# Altium footprint library XU-GENARAL PCB .PcbLib: 1176 footprints (part 33 of 75)
Each footprint in its own frame and in the unit in brackets; x right, y up, seen from the top. Pads: shape width x height; smd on the part's side, far side on the other; paste and mask are expansions set on the pad; w line width, h text height; cw(c..) or ccw(c..) is an arc to the next point about the centre after c.
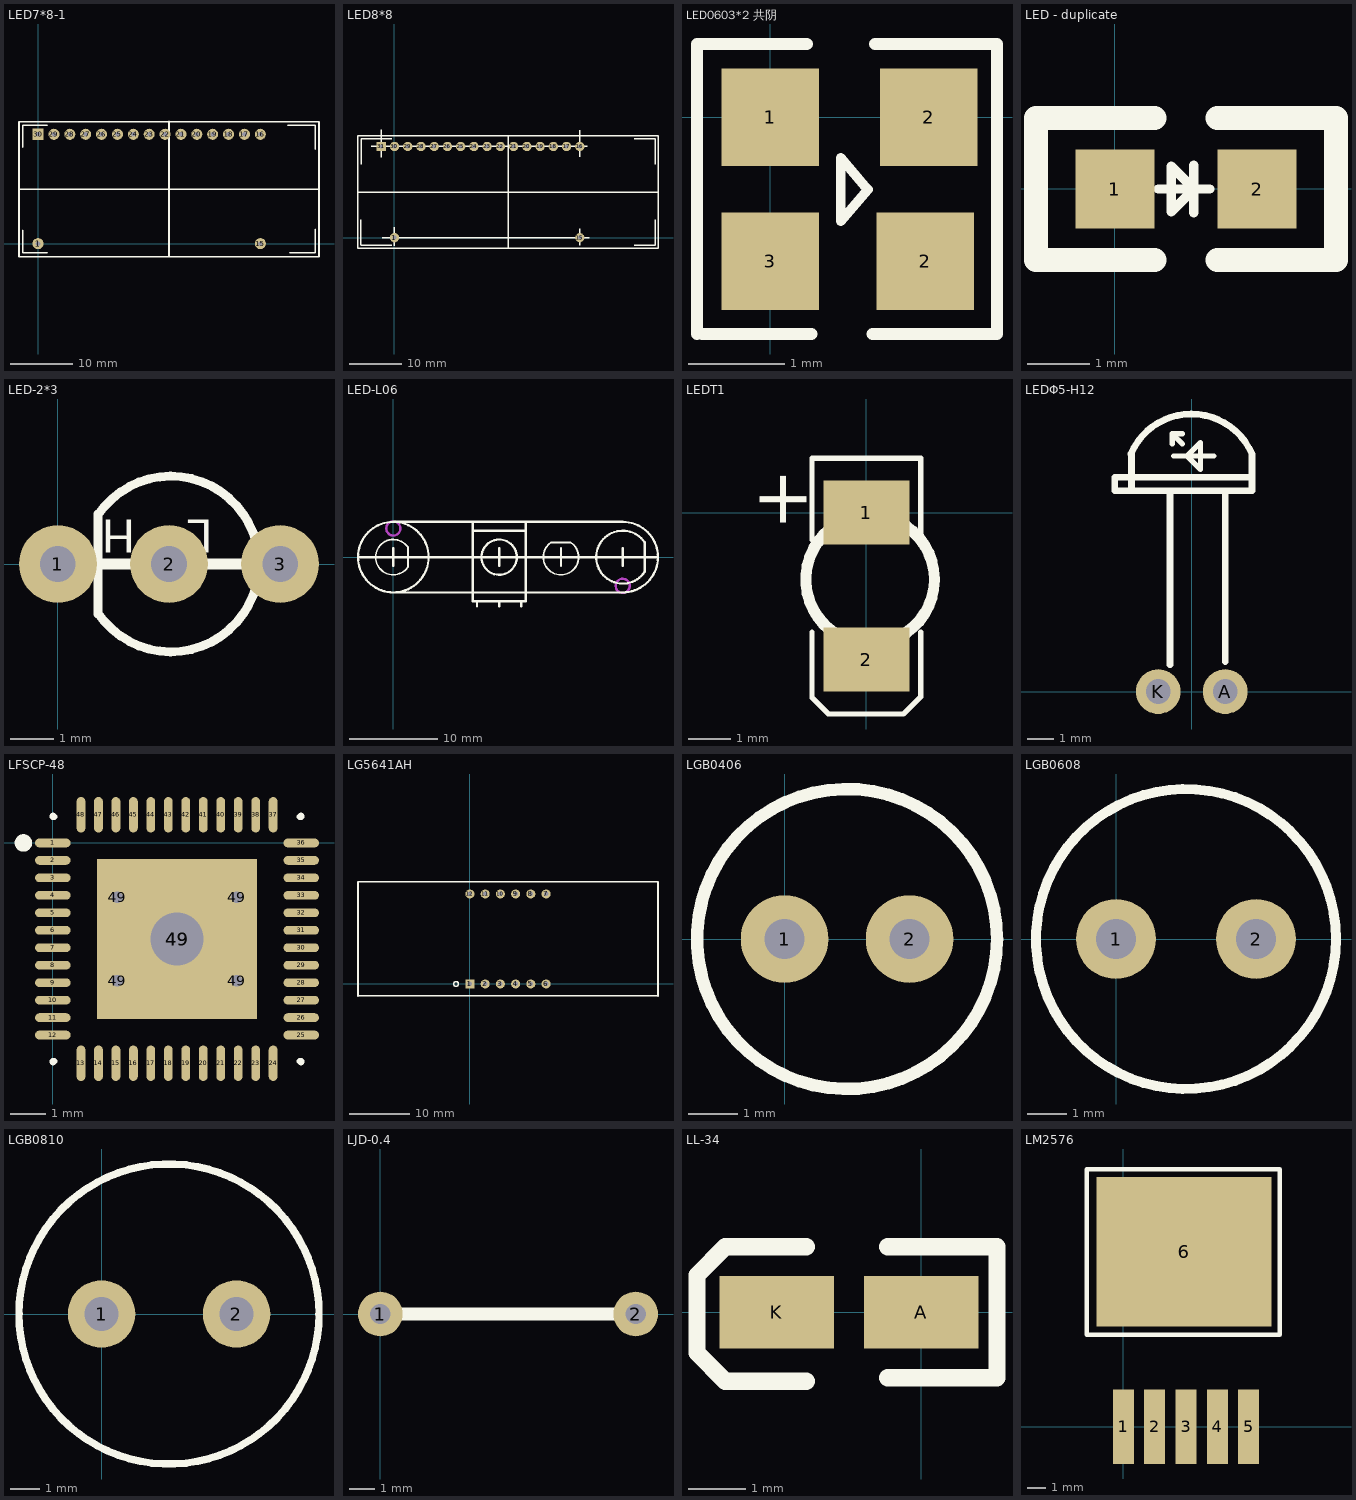
[diagram p32: the footprints below, top view; thin cyan lines are the x and y axes]

## LED7*8-1 [mil]
pads (17):
  round 70 hole 30: 1(0,0) 15(1400,0) 16(1400,688.98) 17(1300,688.98) 18(1200,688.98) 19(1100,688.98) 20(1000,688.98) 21(900,688.98) 22(800,688.98) 23(700,688.98) 24(600,688.98) 25(500,688.98) 26(400,688.98) 27(300,688.98) 28(200,688.98) 29(100,688.98)
  rect 70x70 hole 30: 30(0,688.98)
Top Overlay:
  lines w10: -120.12,343.78 1769.65,343.78 ; -96.38,83 -96.38,-57.8 57.09,-57.8 ; -96.38,607 -96.38,745.36 57.09,745.36 ; 824.88,-81.42 824.88,769.75 ; 1573.91,745.36 1746,745.36 1746.03,595 ; 1585.91,-57.8 1746.03,-57.8 1746.03,91 ; -120,-81.42 1769.65,-81.42 1769.65,768.98 -120,768.98 -120,-81.42

## LED8*8 [mil]
pads (18):
  round 70 hole 30: 1(0,0) 15(1400,0) 16(1400,688.98) 17(1300,688.98) 18(1200,688.98) 19(1100,688.98) 20(1000,688.98) 21(900,688.98) 22(800,688.98) 23(700,688.98) 24(600,688.98) 25(500,688.98) 26(400,688.98) 27(300,688.98) 28(200,688.98) 29(100,688.98) 30(0,688.98)
  rect 70x70 hole 30: 31(-100,688.98)
Top Overlay:
  lines w10: -275.59,344.49 1990.55,344.49 ; -255.91,-57.09 -255.91,135.83 ; -251.97,-57.09 -20.87,-57.09 ; -251.97,553.15 -251.97,746.06 -20.87,746.06 ; -174.02,688.98 -100,688.98 ; -100,607 -100,688.98 ; -100,816 -100,688.98 ; -93,0 0,0 ; 0,-60 0,0 ; 0,80 0,0 ; 857.48,-80.71 857.48,769.68 ; 1400,-56 1400,0 ; 1400,66 1400,0 ; 1400,610 1400,688.98 ; 1400,810 1400,688.98 ; 1457.98,688.98 1400,688.98 ; 1470,0 1400,0 ; 1809.84,-57.09 1968.5,-57.09 1968.5,135.83 ; 1809.84,746.06 1968.5,746.06 1968.5,553.15 ; -100,688.98 1400,688.98 ; 0,0 1400,0 ; -275.59,-80.71 1990.55,-80.71 1990.55,769.68 -275.59,769.68 -275.59,-80.71

## LED0603*2 共阴 [mil]
pads (4):
  rect 40x40 smd: 1(0,0) 2(63.58,-59.06) 2(65,0) 3(0,-59.06)
Top Overlay:
  lines w4: 28.93,-42.74 28.93,-16.74 40.06,-29.74 28.93,-42.74
  lines w5: -30,-89 -30,-30 -30,30 15,30 ; -28,-89 17,-89 ; 42,-89 92,-89 ; 43,30 93,30 93,-89

## LED - duplicate [mil]
height 267.72
pads (2):
  rect 50x50 smd: 1(0,0) 2(90,0)
Top Overlay:
  lines w6: 27.5,0 60,0 ; 50,-15 50,15 ; 35.73,-14.27 50,0 35.73,14.27 35.73,-14.27
  lines w15: 25,-45 -50,-45 -50,45 25,45 ; 65,-45 140,-45 140,45 65,45

## LED-2*3 [mil]
pads (3):
  round 70 hole 32: 1(0,0) 2(100,0) 3(200,0)
Top Overlay:
  lines w8: 36,-45 36,45 ; 36.19,-44.21 ccw(c101.73,0) 36.19,44.21
  lines w10: 30,0 70,0 ; 130,0 170,0
  text "L" at 140,40 h30
  text "H" at 70,40 h30

## LED-L06 [mil]
Top Overlay:
  circle w10: c472.44,0 r78.74
  circle w10: c0,0 r157.48
  lines w8: 65.28,44.03 ccw(c0,0) 65.28,-44.03 65.28,45.97 ; 704,65.28 ccw(c748.03,0) 792.06,65.28 704.27,65.28
  lines w10: -157.48,0 1181.1,0 ; 0,-157.48 1023.62,-157.48 ccw(c1023.62,0) 1023.62,157.48 0,157.48 ; 0,-39.37 0,39.37 ; 354.33,118.11 590.55,118.11 ; 354.33,157.48 354.33,-196.85 590.55,-196.85 590.55,157.48 ; 374.02,-220.47 374.02,-196.85 ; 472.44,-220.47 472.44,-196.85 ; 472.44,-39.37 472.44,39.37 ; 570.87,-220.47 570.87,-196.85 ; 748.03,-39.37 748.03,39.37 ; 1023.62,-39.37 1023.62,39.37 ; 1121.54,-66.05 cw(c1023.62,0) 1121.54,66.05 1121.54,-66.05
Keep-Out Layer:
  circle w10: c1023.62,-127.95 r31.5
  circle w10: c0,127.95 r31.5
Mechanical 1:
  circle w10: c0,127.95 r31.5
  circle w10: c1023.62,-127.95 r31.5

## LEDT1 [mm]
pads (2):
  rect 2x1.5 smd: 1(0,0) 2(0,-3.429)
Top Overlay:
  circle w0.254: c0.085,-1.548 r1.5
  circle w0.254: c0.085,-1.573 r1.5
  lines w0.127: -1.27,-2.794 -1.27,-4.318 -0.889,-4.699 0.864,-4.699 1.27,-4.293 1.27,-2.794 ; -1.27,-0.635 -1.27,1.27 1.27,1.27 1.27,-0.635
  text "+" at -2.492,1.03 h1.27

## LEDΦ5-H12 [mm] "LEDΦ5-12mm隔空90度插件"
height 12
pads (2):
  round 1.7 hole 0.94: A(1.27,0) K(-1.27,0)
Top Overlay:
  lines w0.2: -0.737,9.398 -0.737,9.779 ; -0.686,8.941 0.838,8.941 ; -0.356,9.398 -0.737,9.779 ; -0.356,9.779 -0.737,9.779 ; -0.178,8.941 0.33,8.433 0.33,9.449 -0.178,8.941
  lines w0.254: -2.31,9.017 cw(c-0.012,8.032) 2.286,9.017 2.286,7.62 -2.921,7.62 -2.921,8.128 2.286,8.128 ; -2.286,7.62 -2.286,9.017 ; -0.826,1.016 -0.826,7.493 ; 1.27,1.143 1.27,7.62

## LFSCP-48 [mm] "QFN, 48-Leads, Body 7.0x7.1mm (max), Pitch 0.50mm, IPC Medium Density"
height 0.8
pads (54):
  oval 1.016x0.25 smd: 1(0,0) 2(0,-0.5) 3(0,-1) 4(0,-1.5) 5(0,-2) 6(0,-2.5) 7(0,-3) 8(0,-3.5) 9(0,-4) 10(0,-4.5) 11(0,-5) 12(0,-5.5) 25(7.112,-5.5) 26(7.112,-5) 27(7.112,-4.5) 28(7.112,-4) 29(7.112,-3.5) 30(7.112,-3) 31(7.112,-2.5) 32(7.112,-2) 33(7.112,-1.5) 34(7.112,-1) 35(7.112,-0.5) 36(7.112,0)
  oval 0.25x1.016 smd: 13(0.806,-6.306) 14(1.306,-6.306) 15(1.806,-6.306) 16(2.306,-6.306) 17(2.806,-6.306) 18(3.306,-6.306) 19(3.806,-6.306) 20(4.306,-6.306) 21(4.806,-6.306) 22(5.306,-6.306) 23(5.806,-6.306) 24(6.306,-6.306) 37(6.306,0.806) 38(5.806,0.806) 39(5.306,0.806) 40(4.806,0.806) 41(4.306,0.806) 42(3.806,0.806) 43(3.306,0.806) 44(2.806,0.806) 45(2.306,0.806) 46(1.806,0.806) 47(1.306,0.806) 48(0.806,0.806)
  round 0.66 hole 0.33: 49(1.848,-3.95) 49(1.848,-1.55) 49(5.264,-3.95) 49(5.264,-1.55)
  rect 4.572x4.572 smd: 49(3.556,-2.75)
  round 2.54 hole 1.524: 49(3.556,-2.75)
Top Overlay:
  circle w0.25: c-0.844,0 r0.125
  lines w0.2: 0.006,-6.275 0.006,-6.25 0.031,-6.25 ; 0.006,0.775 0.006,0.75 0.031,0.75 ; 7.081,-6.25 7.106,-6.25 7.106,-6.275 ; 7.081,0.75 7.106,0.75 7.106,0.775
Mechanical 15:
  lines w0.1: 3.056,-2.75 4.056,-2.75 ; 3.556,-3.25 3.556,-2.25

## LG5641AH [mm]
pads (12):
  rect 1.5x1.5 hole 0.762: 1(0,0)
  round 1.5 hole 0.762: 2(2.54,0) 3(5.08,0) 4(7.62,0) 5(10.16,0) 6(12.7,0) 7(12.7,15) 8(10.16,15) 9(7.62,15) 10(5.08,15) 11(2.54,15) 12(0,15)
Top Overlay:
  circle w0.254: c-2.307,0 r0.402
  lines w0.254: -18.65,-2.032 -18.65,17.018 ; -18.65,-2 31.35,-2 ; -18.65,17 31.35,17 31.35,-2.032

## LGB0406 [mil]
pads (2):
  round 70 hole 32: 1(0,0) 2(100,0)
Top Overlay:
  circle w10: c50,0 r120

## LGB0608 [mil]
pads (2):
  round 80 hole 40: 1(0,0) 2(140,0)
Top Overlay:
  circle w10: c70,0 r150

## LGB0810 [mil]
pads (2):
  round 90 hole 45: 1(0,0) 2(180,0)
Top Overlay:
  circle w10: c90,0 r200

## LJD-0.4 [mil]
pads (2):
  round 70 hole 32: 1(0,0) 2(400,0)
Top Overlay:
  lines w20: 0,0 400,0

## LL-34 [mm]
pads (2):
  rect 2x1.27 smd: A(0,0) K(-2.525,0)
Top Overlay:
  lines w0.305: -2.016,-1.2 -3.425,-1.2 -3.921,-0.704 -3.921,0.647 -3.425,1.143 -2.016,1.143 ; -0.584,-1.143 1.321,-1.143 1.321,1.143 -0.584,1.143

## LM2576 [mil]
height 43.31
pads (6):
  rect 45x160 smd: 1(0,0) 2(67,0) 3(134,0) 4(201,0) 5(268,0)
  rect 375x320 smd: 6(130,375)
Top Overlay:
  lines w10: -78.74,196.85 -59.06,196.85 314.96,196.85 334.65,196.85 334.65,551.18 -78.74,551.18 -78.74,196.85